# Altium footprint library discrete.PcbLib: 79 footprints (part 4 of 5)
Each footprint in its own frame and in the unit in brackets; x right, y up, seen from the top. Pads: shape width x height; smd on the part's side, far side on the other; paste and mask are expansions set on the pad; w line width, h text height; cw(c..) or ccw(c..) is an arc to the next point about the centre after c.
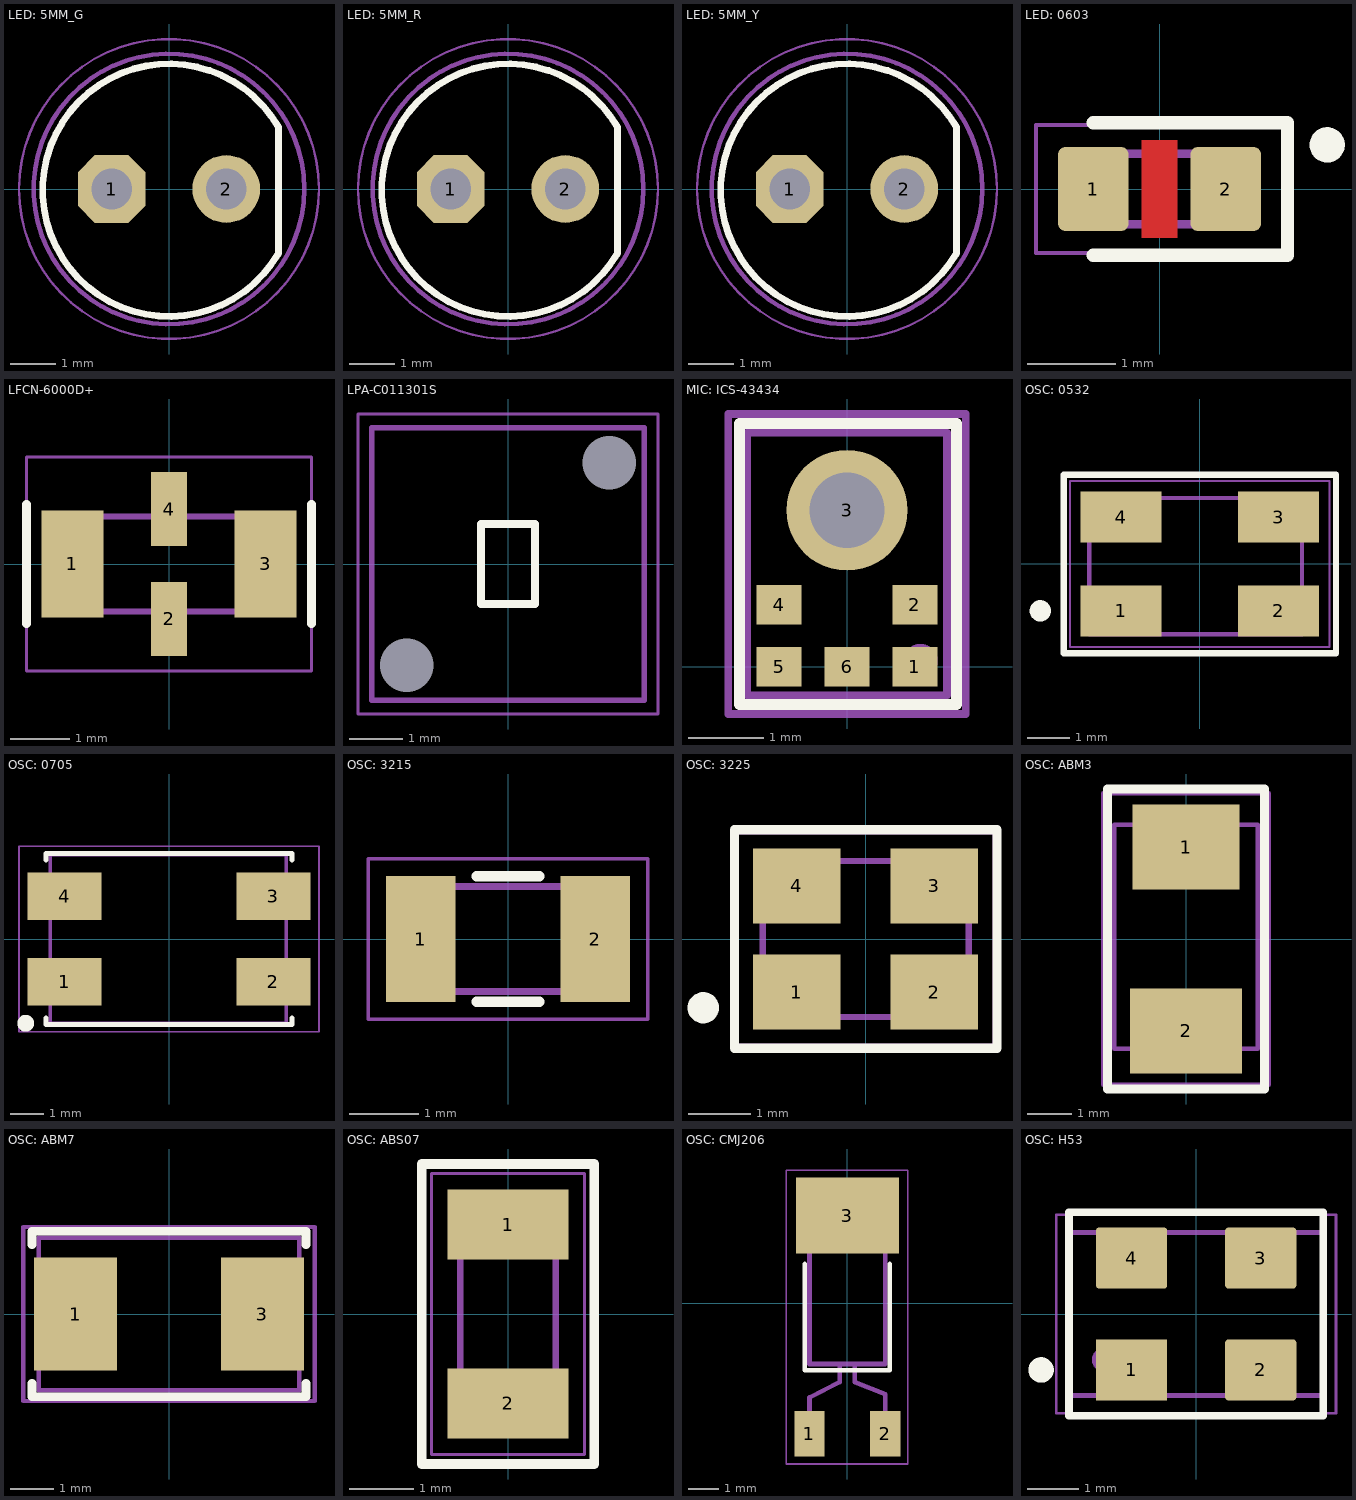
[diagram p3: the footprints below, top view; thin cyan lines are the x and y axes]

## LED: 5MM_G [mm] "Green Leaded Led, 5 mm"
height 12
pads (2):
  oct 1.5x1.5 hole 0.9: 1(-1.27,0)
  round 1.5 hole 0.9: 2(1.27,0)
Top Overlay:
  lines w0.15: 2.425,-1.425 cw(c0,-0.025) 2.425,1.375 2.425,-1.425
Top Assy:
  circle w0.1: c0,0 r3
  text ".Designator" at -1.625,-0.25 h0.75
Top Cortyard:
  circle w0.05: c0,0 r3.325
3D body "5mm_led_grn.STEP": height 14.5, standoff -1, extent -3,-3 3,3

## LED: 5MM_R [mm] "Red Leaded Led, 5 mm"
height 12
pads (2):
  oct 1.5x1.5 hole 0.9: 1(-1.27,0)
  round 1.5 hole 0.9: 2(1.27,0)
Top Overlay:
  lines w0.15: 2.425,-1.425 cw(c0,-0.025) 2.425,1.375 2.425,-1.425
Top Assy:
  circle w0.1: c0,0 r3
  text ".Designator" at -1.725,-0.325 h0.75
Top Cortyard:
  circle w0.05: c0,0 r3.325
3D body "5mm_led_red.STEP": height 14.5, standoff -1, extent -3,-3 3,3

## LED: 5MM_Y [mm] "Yellow Leaded Led, 5 mm"
height 12
pads (2):
  oct 1.5x1.5 hole 0.9: 1(-1.27,0)
  round 1.5 hole 0.9: 2(1.27,0)
Top Overlay:
  lines w0.15: 2.425,-1.425 cw(c0,-0.025) 2.425,1.375 2.425,-1.425
Top Assy:
  circle w0.1: c0,0 r3
  text ".Designator" at -1.775,-0.3 h0.75
Top Cortyard:
  circle w0.05: c0,0 r3.325
3D body "5mm_led_yell.STEP": height 14.5, standoff -1, extent -3,-3 3,3

## LED: 0603 [mm]
pads (2):
  rrect20% 0.8x0.95 smd: 1(-0.75,0) 2(0.75,0)
Top Layer:
  pour cut-out: 0.2,-0.55 0.2,0.55 -0.2,0.55 -0.2,-0.55
Top Overlay:
  circle w0.2: c1.9,0.5 r0.1
  lines w0.15: -0.75,-0.75 1.45,-0.75 1.45,0.75 -0.75,0.75
Top Assy:
  lines w0.1: -0.8,-0.4 0.8,-0.4 0.8,0.4 -0.8,0.4 -0.8,-0.4
  text ".Designator" at -0.595,-0.23 h0.5
Top Cortyard:
  lines w0.05: -1.4,-0.725 -1.4,0.725 1.4,0.725 1.4,-0.725 -1.4,-0.725
3D body "User Library-LED_0603_B.STEP": height 0.6, standoff 0, extent -0.8,-0.4 0.8,0.4

## LFCN-6000D+ [mm]
pads (4):
  rect 1.04x1.8 smd: 1(-1.625,0) 3(1.625,0)
  rect 0.61x1.245 smd: 2(0,-0.925) 4(0,0.925)
Top Overlay:
  lines w0.15: -2.4,-1 -2.4,1 ; 2.4,-1 2.4,1
Top Assy:
  lines w0.1: -1.6,-0.8 -1.6,0.8 1.6,0.8 1.6,-0.8 -1.6,-0.8
  text ".Designator" at -0.947,-0.386 h0.75
Top Cortyard:
  lines w0.05: -2.4,-1.8 -2.4,1.8 2.4,1.8 2.4,-1.8 -2.4,-1.8
3D body: height 0.94, standoff 0, extent -1.6,-0.8 1.6,0.8

## LPA-C011301S [mm] "Light Guide"
pads (2):
  round 0 hole 1: 0(-1.89,-1.89) 0(1.89,1.89)
Top Overlay:
  lines w0.15: -0.5,-0.75 -0.5,0.75 0.5,0.75 0.5,-0.75 -0.5,-0.75
Top Assy:
  lines w0.1: -2.54,-2.54 2.54,-2.54 2.54,2.54 -2.54,2.54 -2.54,-2.54
Top Cortyard:
  lines w0.05: -2.8,-2.8 2.8,-2.8 2.8,2.8 -2.8,2.8 -2.8,-2.8
3D body "LPA-C011301S-30.STEP": height 34.7, standoff -2.3, extent -2.54,-2.54 2.54,2.54

## MIC: ICS-43434 [mm] "DPDT, 8.5x8.5x14"
height 14
pads (6):
  rect 0.6x0.522 smd: 1(0.9,0) 2(0.9,0.822) 4(-0.9,0.822) 5(-0.9,0) 6(0,0)
  round 1.6 hole 1: 3(0,2.074)
Top Overlay:
  lines w0.15: -1.425,-0.5 -1.425,3.225 1.45,3.225 1.45,-0.5 -1.425,-0.5
Top Assy:
  lines w0.1: -1.325,-0.375 -1.325,3.1 1.325,3.1 1.325,-0.375 -1.325,-0.375
  lines w0.254: 1.073,0.055 cw(c0.972,0.075) 1.075,0.075
  text ".Designator" at -0.75,1.233 h1
Top Cortyard:
  lines w0.1: -1.575,-0.625 1.575,-0.625 1.575,3.35 -1.575,3.35 -1.575,-0.625
3D body "ICS-43434.STEP": height 0.99, standoff 0.01, extent -1.325,-0.385 1.325,3.115

## OSC: 0532 [mm]
height 1
pads (4):
  rect 1.9x1.2 smd: 1(-1.85,-1.1) 2(1.85,-1.1) 3(1.85,1.1) 4(-1.85,1.1)
Top Overlay:
  circle w0.3: c-3.75,-1.1 r0.1
  lines w0.15: -3.2,-2.1 3.2,-2.1 3.2,2.1 -3.2,2.1 -3.2,-2.1
Top Assy:
  circle w0.3: c-2,-1.1 r0.1
  lines w0.1: -2.6,-1.65 2.4,-1.65 2.4,1.55 -2.6,1.55 -2.6,-1.65
  text ".Designator" at -1.4,-0.392 h1
Top Cortyard:
  lines w0.05: -3.05,-1.95 3.05,-1.95 3.05,1.95 -3.05,1.95 -3.05,-1.95

## OSC: 0705 [mm]
height 1.2
pads (4):
  rect 2.2x1.4 smd: 1(-3.1,-1.27) 2(3.1,-1.27) 3(3.1,1.27) 4(-3.1,1.27)
Top Overlay:
  circle w0.3: c-4.25,-2.5 r0.1
  lines w0.15: -3.65,-2.35 -3.65,-2.54 3.65,-2.54 3.65,-2.35 ; -3.65,2.35 -3.65,2.54 3.65,2.54 3.65,2.35
Top Assy:
  circle w0.3: c-2.5,-1.6 r0.1
  lines w0.1: -3.526,-2.5 3.474,-2.5 3.474,2.5 -3.526,2.5 -3.526,-2.5
  text ".Designator" at -1.65,-0.367 h1
Top Cortyard:
  lines w0.05: -4.45,-2.75 -4.45,2.75 4.45,2.75 4.45,-2.75 -4.45,-2.75
3D body "KX-13 QSMD7.0x5.0x1.3.step": height 1.3, standoff 0, extent -3.526,-2.5 3.474,2.5

## OSC: 3215 [mm]
height 0.75
pads (2):
  rect 1x1.8 smd: 1(-1.25,0) 2(1.25,0)
Top Overlay:
  lines w0.15: -0.45,-0.9 0.45,-0.9 ; -0.45,0.9 0.45,0.9
Top Assy:
  lines w0.1: -1.6,-0.75 1.6,-0.75 1.6,0.75 -1.6,0.75 -1.6,-0.75
  text ".Designator" at -1.175,-0.233 h0.5
Top Cortyard:
  lines w0.05: -2,-1.15 2,-1.15 2,1.15 -2,1.15 -2,-1.15

## OSC: 3225 [mm]
height 0.8
pads (4):
  rect 1.4x1.2 smd: 1(-1.1,-0.85) 2(1.1,-0.85) 3(1.1,0.85) 4(-1.1,0.85)
Top Overlay:
  circle w0.3: c-2.6,-1.1 r0.1
  lines w0.15: -2.1,-1.75 2.1,-1.75 2.1,1.75 -2.1,1.75 -2.1,-1.75
Top Assy:
  circle w0.3: c-1,-0.75 r0.1
  lines w0.1: -1.65,-1.25 1.65,-1.25 1.65,1.25 -1.65,1.25 -1.65,-1.25
  text ".Designator" at -0.575,-0.163 h0.75
Top Cortyard:
  lines w0.05: -2.05,-1.7 2.05,-1.7 2.05,1.7 -2.05,1.7 -2.05,-1.7

## OSC: ABM3 [mm] "Quartz"
height 1.5
pads (2):
  rect 2.4x1.9 smd: 1(0,2.05)
  rect 2.5x1.9 smd: 2(0,-2.05)
Top Overlay:
  lines w0.2: -1.75,-3.35 1.75,-3.35 1.75,-3.2 1.75,3.35 -1.75,3.35 -1.75,-3.35
Top Assy:
  lines w0.1: -1.6,-2.45 1.6,-2.45 1.6,2.55 -1.6,2.55 -1.6,-2.45
  text ".Designator" at 0.133,-1.75 h0.5
Top Cortyard:
  lines w0.1: -1.85,-3.25 -1.85,3.25 1.85,3.25 1.85,-3.25 -1.85,-3.25
3D body "ABM3.STEP": height 1.3, standoff 0, extent -1.6,-2.5 1.6,2.5

## OSC: ABM7 [mm]
pads (2):
  rect 1.9x2.6 smd: 1(-2.15,0) 3(2.15,0)
Top Overlay:
  lines w0.2: -3.15,-1.6 -3.15,-1.9 3.15,-1.9 3.15,-1.6 ; -3.15,1.6 -3.15,1.9 3.15,1.9 3.15,1.6
Top Assy:
  lines w0.1: -2.997,-1.752 -2.997,1.753 2.997,1.753 2.997,-1.752 -2.997,-1.752
  text ".Designator" at -2.225,-0.417 h1
Top Cortyard:
  lines w0.1: -3.35,-2 -3.35,2 3.35,2 3.35,-2 -3.35,-2
3D body "ABM7.STEP": height 1.4, standoff 0, extent -2.997,-1.752 2.997,1.753

## OSC: ABS07 [mm] "Quartz"
height 0.9
pads (2):
  rect 1.9x1.1 smd: 1(0,1.4) 2(0,-1.4)
Top Overlay:
  lines w0.15: -1.35,-2.35 1.35,-2.35 1.35,2.35 -1.35,2.35 -1.35,-2.35
Top Assy:
  lines w0.1: -0.75,-1.6 0.75,-1.6 0.75,1.6 -0.75,1.6 -0.75,-1.6
  text ".Designator" at 0.376,-0.782 h0.75
Top Cortyard:
  lines w0.05: -1.2,-2.2 1.2,-2.2 1.2,2.2 -1.2,2.2 -1.2,-2.2
3D body "ABS07.STEP": height 0.89, standoff 0, extent -0.749,-1.6 0.749,1.6

## OSC: CMJ206 [mm]
pads (3):
  rect 1x1.5 smd: 1(-1.25,-4.3) 2(1.25,-4.3)
  rect 3.4x2.5 smd: 3(0,2.9)
Top Overlay:
  lines w0.15: -1.4,1.3 -1.4,-2.2 1.4,-2.2 1.4,1.3
Top Assy:
  lines w0.15: -1.25,-4.3 -1.25,-3.1 -0.25,-2.6 -0.25,-2 ; 0.25,-2 0.25,-2.6 1.25,-3 1.25,-4.3 ; -1.25,-2 -1.25,4 1.25,4 1.25,-2 -1.25,-2
  text ".Designator" at 0.458,-0.75 h1.25
Top Cortyard:
  lines w0.05: -2.025,-5.3 2,-5.3 2,4.4 -2.025,4.4 -2.025,-5.3

## OSC: H53 [mm]
height 1.2
pads (4):
  rect 1.4x1.2 smd: 1(-1.27,-1.1)
  rrect10% 1.4x1.2 smd: 2(1.27,-1.1) 3(1.27,1.1) 4(-1.27,1.1)
Top Overlay:
  circle w0.3: c-3.05,-1.1 r0.1
  lines w0.15: -2.5,-2 -2.5,2 2.5,2 2.5,-2 -2.5,-2
Top Assy:
  circle w0.3: c-1.8,-0.9 r0.1
  lines w0.1: -2.5,-1.6 2.5,-1.6 2.5,1.6 -2.5,1.6 -2.5,-1.6
  text ".Designator" at -1.473,-0.381 h1
Top Cortyard:
  lines w0.05: -2.75,-1.95 2.75,-1.95 2.75,1.95 -2.75,1.95 -2.75,-1.95